# Altium schematic symbol library jlcpcb_2025_04_capacitors_extended_1210.schlib: 709 symbols (part 2 of 4) (continued)
## CC1210JKNPO0BN222
designator C?  Capacitance: 2.2nF  (hidden comment: *)
Capacitor, Ceramic (MLCC), 2.2nF, ±5%, 100V, NP0, ±5%, SMD 1210; Manufacturer: YAGEO; Manufacturer Part Number: CC1210JKNPO0BN222; Package Size: 1210; JLCPCB Basic Part: No; JLCPCB Part Number: C577264; Supplier 1: LCSC; Category: Capacitors - MLCC; Supplier Part Number 1: C577264; Tolerance: ±5%; Voltage Rating: 100V; Temperature Coefficient: NP0; RoHS: Yes; ComponentLink1Description: Datasheet; ComponentLink1URL: https://wmsc.lcsc.com/wmsc/upload/file/pdf/v2/lcsc/2008171234_YAGEO-CC1210JKNPO0BN222_C577264.pdf; ComponentLink2Description: JLCPCB Part URL; ComponentLink2URL: https://jlcpcb.com/partdetail/C577264; ComponentLink3Description: LCSC Part URL; ComponentLink3URL: https://lcsc.com/product-detail/Multilayer-Ceramic-Capacitors-MLCC---SMD-SMT_YAGEO-YAGEO-CC1210JKNPO0BN222_C577264.html
footprint CAP-1210 (1210 (3225M) Capacitor)
pins: 1, 2

## CC1210JKNPO9BN472
designator C?  Capacitance: 4.7nF  (hidden comment: *)
Capacitor, Ceramic (MLCC), 4.7nF, ±5%, 50V, NP0, ±5%, SMD 1210; Manufacturer: YAGEO; Manufacturer Part Number: CC1210JKNPO9BN472; Package Size: 1210; JLCPCB Basic Part: No; JLCPCB Part Number: C577266; Supplier 1: LCSC; Category: Capacitors - MLCC; Supplier Part Number 1: C577266; Tolerance: ±5%; Voltage Rating: 50V; Temperature Coefficient: NP0; RoHS: Yes; ComponentLink1Description: Datasheet; ComponentLink1URL: https://wmsc.lcsc.com/wmsc/upload/file/pdf/v2/lcsc/2008201234_YAGEO-CC1210JKNPO9BN472_C577266.pdf; ComponentLink2Description: JLCPCB Part URL; ComponentLink2URL: https://jlcpcb.com/partdetail/C577266; ComponentLink3Description: LCSC Part URL; ComponentLink3URL: https://lcsc.com/product-detail/Multilayer-Ceramic-Capacitors-MLCC---SMD-SMT_YAGEO-YAGEO-CC1210JKNPO9BN472_C577266.html
footprint CAP-1210 (1210 (3225M) Capacitor)
pins: 1, 2

## CC1210JKNPOCBN471
designator C?  Capacitance: 470pF  (hidden comment: *)
Capacitor, Ceramic (MLCC), 470pF, ±5%, 1kV, NP0, ±5%, SMD 1210; Manufacturer: YAGEO; Manufacturer Part Number: CC1210JKNPOCBN471; Package Size: 1210; JLCPCB Basic Part: No; JLCPCB Part Number: C577269; Supplier 1: LCSC; Category: Capacitors - MLCC; Supplier Part Number 1: C577269; Tolerance: ±5%; Voltage Rating: 1kV; Temperature Coefficient: NP0; RoHS: Yes; ComponentLink1Description: Datasheet; ComponentLink1URL: https://wmsc.lcsc.com/wmsc/upload/file/pdf/v2/lcsc/2204121100_YAGEO-CC1210JKNPOCBN471_C577269.pdf; ComponentLink2Description: JLCPCB Part URL; ComponentLink2URL: https://jlcpcb.com/partdetail/C577269; ComponentLink3Description: LCSC Part URL; ComponentLink3URL: https://lcsc.com/product-detail/Multilayer-Ceramic-Capacitors-MLCC---SMD-SMT_YAGEO-YAGEO-CC1210JKNPOCBN471_C577269.html
footprint CAP-1210 (1210 (3225M) Capacitor)
pins: 1, 2

## CC1210JKNPODBN221
designator C?  Capacitance: 220pF  (hidden comment: *)
Capacitor, Ceramic (MLCC), 220pF, ±5%, 2kV, NP0, ±5%, SMD 1210; Manufacturer: YAGEO; Manufacturer Part Number: CC1210JKNPODBN221; Package Size: 1210; JLCPCB Basic Part: No; JLCPCB Part Number: C2175583; Supplier 1: LCSC; Category: Capacitors - MLCC; Supplier Part Number 1: C2175583; Tolerance: ±5%; Voltage Rating: 2kV; Temperature Coefficient: NP0; RoHS: Yes; ComponentLink1Description: Datasheet; ComponentLink1URL: https://wmsc.lcsc.com/wmsc/upload/file/pdf/v2/lcsc/2108051830_YAGEO-CC1210JKNPODBN221_C2175583.pdf; ComponentLink2Description: JLCPCB Part URL; ComponentLink2URL: https://jlcpcb.com/partdetail/C2175583; ComponentLink3Description: LCSC Part URL; ComponentLink3URL: https://lcsc.com/product-detail/Multilayer-Ceramic-Capacitors-MLCC---SMD-SMT_YAGEO-YAGEO-CC1210JKNPODBN221_C2175583.html
footprint CAP-1210 (1210 (3225M) Capacitor)
pins: 1, 2

## CC1210KKX5R6BB226
designator C?  Capacitance: 22uF  (hidden comment: *)
Capacitor, Ceramic (MLCC), 22uF, ±10%, 10V, X5R, ±10%, SMD 1210; Manufacturer: YAGEO; Manufacturer Part Number: CC1210KKX5R6BB226; Package Size: 1210; JLCPCB Basic Part: No; JLCPCB Part Number: C3879681; Supplier 1: LCSC; Category: Capacitors - MLCC; Supplier Part Number 1: C3879681; Tolerance: ±10%; Voltage Rating: 10V; Temperature Coefficient: X5R; RoHS: Yes; ComponentLink1Description: Datasheet; ComponentLink1URL: https://wmsc.lcsc.com/wmsc/upload/file/pdf/v2/lcsc/2407081117_YAGEO-CC1210KKX5R6BB226_C3879681.pdf; ComponentLink2Description: JLCPCB Part URL; ComponentLink2URL: https://jlcpcb.com/partdetail/C3879681; ComponentLink3Description: LCSC Part URL; ComponentLink3URL: https://lcsc.com/product-detail/Multilayer-Ceramic-Capacitors-MLCC---SMD-SMT_YAGEO-YAGEO-CC1210KKX5R6BB226_C3879681.html
footprint CAP-1210 (1210 (3225M) Capacitor)
pins: 1, 2

## CC1210KKX5R7BB106
designator C?  Capacitance: 10uF  (hidden comment: *)
Capacitor, Ceramic (MLCC), 10uF, ±10%, 16V, X5R, ±10%, SMD 1210; Manufacturer: YAGEO; Manufacturer Part Number: CC1210KKX5R7BB106; Package Size: 1210; JLCPCB Basic Part: No; JLCPCB Part Number: C2179259; Supplier 1: LCSC; Category: Capacitors - MLCC; Supplier Part Number 1: C2179259; Tolerance: ±10%; Voltage Rating: 16V; Temperature Coefficient: X5R; RoHS: Yes; ComponentLink1Description: Datasheet; ComponentLink1URL: https://wmsc.lcsc.com/wmsc/upload/file/pdf/v2/lcsc/2407081117_YAGEO-CC1210KKX5R7BB106_C2179259.pdf; ComponentLink2Description: JLCPCB Part URL; ComponentLink2URL: https://jlcpcb.com/partdetail/C2179259; ComponentLink3Description: LCSC Part URL; ComponentLink3URL: https://lcsc.com/product-detail/Multilayer-Ceramic-Capacitors-MLCC---SMD-SMT_YAGEO-YAGEO-CC1210KKX5R7BB106_C2179259.html
footprint CAP-1210 (1210 (3225M) Capacitor)
pins: 1, 2

## CC1210KKX5R7BB226
designator C?  Capacitance: 22uF  (hidden comment: *)
Capacitor, Ceramic (MLCC), 22uF, ±10%, 16V, X5R, ±10%, SMD 1210; Manufacturer: YAGEO; Manufacturer Part Number: CC1210KKX5R7BB226; Package Size: 1210; JLCPCB Basic Part: No; JLCPCB Part Number: C596321; Supplier 1: LCSC; Category: Capacitors - MLCC; Supplier Part Number 1: C596321; Tolerance: ±10%; Voltage Rating: 16V; Temperature Coefficient: X5R; RoHS: Yes; ComponentLink1Description: Datasheet; ComponentLink1URL: https://wmsc.lcsc.com/wmsc/upload/file/pdf/v2/lcsc/2407081117_YAGEO-CC1210KKX5R7BB226_C596321.pdf; ComponentLink2Description: JLCPCB Part URL; ComponentLink2URL: https://jlcpcb.com/partdetail/C596321; ComponentLink3Description: LCSC Part URL; ComponentLink3URL: https://lcsc.com/product-detail/Multilayer-Ceramic-Capacitors-MLCC---SMD-SMT_YAGEO-YAGEO-CC1210KKX5R7BB226_C596321.html
footprint CAP-1210 (1210 (3225M) Capacitor)
pins: 1, 2

## CC1210KKX5R7BB475
designator C?  Capacitance: 4.7uF  (hidden comment: *)
Capacitor, Ceramic (MLCC), 4.7uF, ±10%, 16V, X5R, ±10%, SMD 1210; Manufacturer: YAGEO; Manufacturer Part Number: CC1210KKX5R7BB475; Package Size: 1210; JLCPCB Basic Part: No; JLCPCB Part Number: C2177070; Supplier 1: LCSC; Category: Capacitors - MLCC; Supplier Part Number 1: C2177070; Tolerance: ±10%; Voltage Rating: 16V; Temperature Coefficient: X5R; RoHS: Yes; ComponentLink1Description: Datasheet; ComponentLink1URL: https://wmsc.lcsc.com/wmsc/upload/file/pdf/v2/lcsc/2407081117_YAGEO-CC1210KKX5R7BB475_C2177070.pdf; ComponentLink2Description: JLCPCB Part URL; ComponentLink2URL: https://jlcpcb.com/partdetail/C2177070; ComponentLink3Description: LCSC Part URL; ComponentLink3URL: https://lcsc.com/product-detail/Multilayer-Ceramic-Capacitors-MLCC---SMD-SMT_YAGEO-YAGEO-CC1210KKX5R7BB475_C2177070.html
footprint CAP-1210 (1210 (3225M) Capacitor)
pins: 1, 2

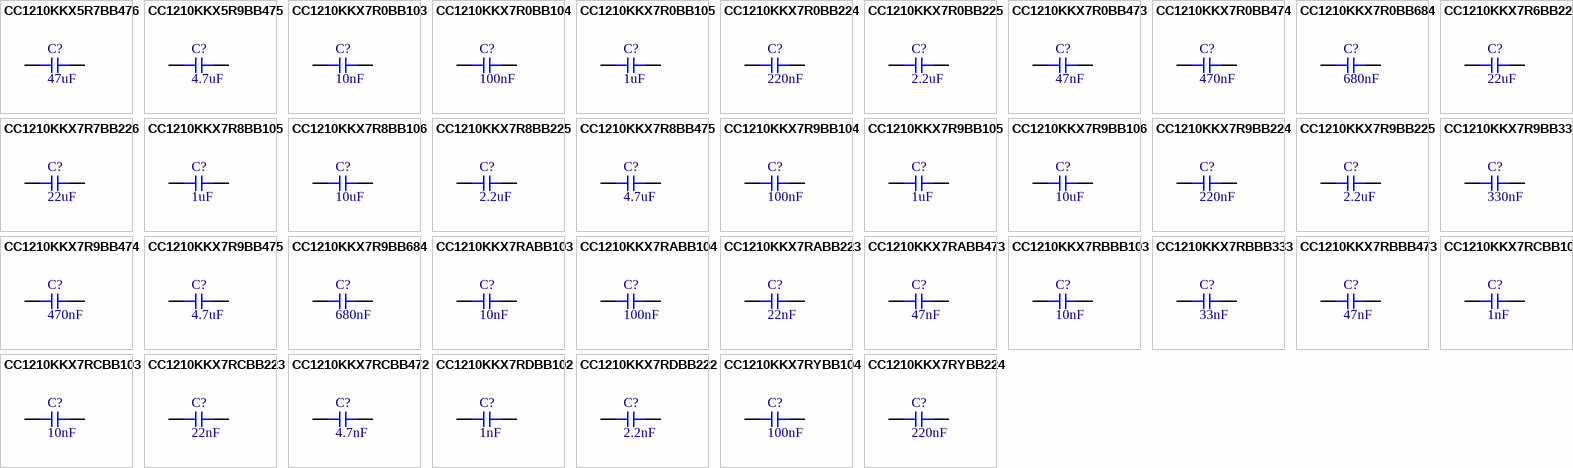
[diagram p7: symbols CC1210KKX5R7BB476 to CC1210KKX7RYBB224]

## CC1210KKX5R7BB476
designator C?  Capacitance: 47uF  (hidden comment: *)
Capacitor, Ceramic (MLCC), 47uF, ±10%, 16V, X5R, ±10%, SMD 1210; Manufacturer: YAGEO; Manufacturer Part Number: CC1210KKX5R7BB476; Package Size: 1210; JLCPCB Basic Part: No; JLCPCB Part Number: C596320; Supplier 1: LCSC; Category: Capacitors - MLCC; Supplier Part Number 1: C596320; Tolerance: ±10%; Voltage Rating: 16V; Temperature Coefficient: X5R; RoHS: Yes; ComponentLink1Description: Datasheet; ComponentLink1URL: https://wmsc.lcsc.com/wmsc/upload/file/pdf/v2/lcsc/2407081117_YAGEO-CC1210KKX5R7BB476_C596320.pdf; ComponentLink2Description: JLCPCB Part URL; ComponentLink2URL: https://jlcpcb.com/partdetail/C596320; ComponentLink3Description: LCSC Part URL; ComponentLink3URL: https://lcsc.com/product-detail/Multilayer-Ceramic-Capacitors-MLCC---SMD-SMT_YAGEO-YAGEO-CC1210KKX5R7BB476_C596320.html
footprint CAP-1210 (1210 (3225M) Capacitor)
pins: 1, 2

## CC1210KKX5R9BB475
designator C?  Capacitance: 4.7uF  (hidden comment: *)
Capacitor, Ceramic (MLCC), 4.7uF, ±10%, 50V, X5R, ±10%, SMD 1210; Manufacturer: YAGEO; Manufacturer Part Number: CC1210KKX5R9BB475; Package Size: 1210; JLCPCB Basic Part: No; JLCPCB Part Number: C1952590; Supplier 1: LCSC; Category: Capacitors - MLCC; Supplier Part Number 1: C1952590; Tolerance: ±10%; Voltage Rating: 50V; Temperature Coefficient: X5R; RoHS: Yes; ComponentLink1Description: Datasheet; ComponentLink1URL: https://wmsc.lcsc.com/wmsc/upload/file/pdf/v2/lcsc/2407081117_YAGEO-CC1210KKX5R9BB475_C1952590.pdf; ComponentLink2Description: JLCPCB Part URL; ComponentLink2URL: https://jlcpcb.com/partdetail/C1952590; ComponentLink3Description: LCSC Part URL; ComponentLink3URL: https://lcsc.com/product-detail/Multilayer-Ceramic-Capacitors-MLCC---SMD-SMT_YAGEO-YAGEO-CC1210KKX5R9BB475_C1952590.html
footprint CAP-1210 (1210 (3225M) Capacitor)
pins: 1, 2

## CC1210KKX7R0BB103
designator C?  Capacitance: 10nF  (hidden comment: *)
Capacitor, Ceramic (MLCC), 10nF, ±10%, 100V, X7R, ±10%, SMD 1210; Manufacturer: YAGEO; Manufacturer Part Number: CC1210KKX7R0BB103; Package Size: 1210; JLCPCB Basic Part: No; JLCPCB Part Number: C527374; Supplier 1: LCSC; Category: Capacitors - MLCC; Supplier Part Number 1: C527374; Tolerance: ±10%; Voltage Rating: 100V; Temperature Coefficient: X7R; RoHS: Yes; ComponentLink1Description: Datasheet; ComponentLink1URL: https://wmsc.lcsc.com/wmsc/upload/file/pdf/v2/lcsc/2007091835_YAGEO-CC1210KKX7R0BB103_C527374.pdf; ComponentLink2Description: JLCPCB Part URL; ComponentLink2URL: https://jlcpcb.com/partdetail/C527374; ComponentLink3Description: LCSC Part URL; ComponentLink3URL: https://lcsc.com/product-detail/Multilayer-Ceramic-Capacitors-MLCC---SMD-SMT_YAGEO-YAGEO-CC1210KKX7R0BB103_C527374.html
footprint CAP-1210 (1210 (3225M) Capacitor)
pins: 1, 2

## CC1210KKX7R0BB104
designator C?  Capacitance: 100nF  (hidden comment: *)
Capacitor, Ceramic (MLCC), 100nF, ±10%, 100V, X7R, ±10%, SMD 1210; Manufacturer: YAGEO; Manufacturer Part Number: CC1210KKX7R0BB104; Package Size: 1210; JLCPCB Basic Part: No; JLCPCB Part Number: C527375; Supplier 1: LCSC; Category: Capacitors - MLCC; Supplier Part Number 1: C527375; Tolerance: ±10%; Voltage Rating: 100V; Temperature Coefficient: X7R; RoHS: Yes; ComponentLink1Description: Datasheet; ComponentLink1URL: https://wmsc.lcsc.com/wmsc/upload/file/pdf/v2/lcsc/2005261833_YAGEO-CC1210KKX7R0BB104_C527375.pdf; ComponentLink2Description: JLCPCB Part URL; ComponentLink2URL: https://jlcpcb.com/partdetail/C527375; ComponentLink3Description: LCSC Part URL; ComponentLink3URL: https://lcsc.com/product-detail/Multilayer-Ceramic-Capacitors-MLCC---SMD-SMT_YAGEO-YAGEO-CC1210KKX7R0BB104_C527375.html
footprint CAP-1210 (1210 (3225M) Capacitor)
pins: 1, 2

## CC1210KKX7R0BB105
designator C?  Capacitance: 1uF  (hidden comment: *)
Capacitor, Ceramic (MLCC), 1uF, ±10%, 100V, X7R, ±10%, SMD 1210; Manufacturer: YAGEO; Manufacturer Part Number: CC1210KKX7R0BB105; Package Size: 1210; JLCPCB Basic Part: No; JLCPCB Part Number: C577270; Supplier 1: LCSC; Category: Capacitors - MLCC; Supplier Part Number 1: C577270; Tolerance: ±10%; Voltage Rating: 100V; Temperature Coefficient: X7R; RoHS: Yes; ComponentLink1Description: Datasheet; ComponentLink1URL: https://wmsc.lcsc.com/wmsc/upload/file/pdf/v2/lcsc/2009261809_YAGEO-CC1210KKX7R0BB105_C577270.pdf; ComponentLink2Description: JLCPCB Part URL; ComponentLink2URL: https://jlcpcb.com/partdetail/C577270; ComponentLink3Description: LCSC Part URL; ComponentLink3URL: https://lcsc.com/product-detail/Multilayer-Ceramic-Capacitors-MLCC---SMD-SMT_YAGEO-YAGEO-CC1210KKX7R0BB105_C577270.html
footprint CAP-1210 (1210 (3225M) Capacitor)
pins: 1, 2

## CC1210KKX7R0BB224
designator C?  Capacitance: 220nF  (hidden comment: *)
Capacitor, Ceramic (MLCC), 220nF, ±10%, 100V, X7R, ±10%, SMD 1210; Manufacturer: YAGEO; Manufacturer Part Number: CC1210KKX7R0BB224; Package Size: 1210; JLCPCB Basic Part: No; JLCPCB Part Number: C326640; Supplier 1: LCSC; Category: Capacitors - MLCC; Supplier Part Number 1: C326640; Tolerance: ±10%; Voltage Rating: 100V; Temperature Coefficient: X7R; RoHS: Yes; ComponentLink1Description: Datasheet; ComponentLink1URL: https://wmsc.lcsc.com/wmsc/upload/file/pdf/v2/lcsc/1811141242_YAGEO-CC1210KKX7R0BB224_C326640.pdf; ComponentLink2Description: JLCPCB Part URL; ComponentLink2URL: https://jlcpcb.com/partdetail/C326640; ComponentLink3Description: LCSC Part URL; ComponentLink3URL: https://lcsc.com/product-detail/Multilayer-Ceramic-Capacitors-MLCC---SMD-SMT_YAGEO-YAGEO-CC1210KKX7R0BB224_C326640.html
footprint CAP-1210 (1210 (3225M) Capacitor)
pins: 1, 2

## CC1210KKX7R0BB225
designator C?  Capacitance: 2.2uF  (hidden comment: *)
Capacitor, Ceramic (MLCC), 2.2uF, ±10%, 100V, X7R, ±10%, SMD 1210; Manufacturer: YAGEO; Manufacturer Part Number: CC1210KKX7R0BB225; Package Size: 1210; JLCPCB Basic Part: No; JLCPCB Part Number: C577271; Supplier 1: LCSC; Category: Capacitors - MLCC; Supplier Part Number 1: C577271; Tolerance: ±10%; Voltage Rating: 100V; Temperature Coefficient: X7R; RoHS: Yes; ComponentLink1Description: Datasheet; ComponentLink1URL: https://wmsc.lcsc.com/wmsc/upload/file/pdf/v2/lcsc/2012141237_YAGEO-CC1210KKX7R0BB225_C577271.pdf; ComponentLink2Description: JLCPCB Part URL; ComponentLink2URL: https://jlcpcb.com/partdetail/C577271; ComponentLink3Description: LCSC Part URL; ComponentLink3URL: https://lcsc.com/product-detail/Multilayer-Ceramic-Capacitors-MLCC---SMD-SMT_YAGEO-YAGEO-CC1210KKX7R0BB225_C577271.html
footprint CAP-1210 (1210 (3225M) Capacitor)
pins: 1, 2

## CC1210KKX7R0BB473
designator C?  Capacitance: 47nF  (hidden comment: *)
Capacitor, Ceramic (MLCC), 47nF, ±10%, 100V, X7R, ±10%, SMD 1210; Manufacturer: YAGEO; Manufacturer Part Number: CC1210KKX7R0BB473; Package Size: 1210; JLCPCB Basic Part: No; JLCPCB Part Number: C2897342; Supplier 1: LCSC; Category: Capacitors - MLCC; Supplier Part Number 1: C2897342; Tolerance: ±10%; Voltage Rating: 100V; Temperature Coefficient: X7R; RoHS: Yes; ComponentLink1Description: Datasheet; ComponentLink1URL: https://wmsc.lcsc.com/wmsc/upload/file/pdf/v2/lcsc/2211211800_YAGEO-CC1210KKX7R0BB473_C2897342.pdf; ComponentLink2Description: JLCPCB Part URL; ComponentLink2URL: https://jlcpcb.com/partdetail/C2897342; ComponentLink3Description: LCSC Part URL; ComponentLink3URL: https://lcsc.com/product-detail/Multilayer-Ceramic-Capacitors-MLCC---SMD-SMT_YAGEO-YAGEO-CC1210KKX7R0BB473_C2897342.html
footprint CAP-1210 (1210 (3225M) Capacitor)
pins: 1, 2

## CC1210KKX7R0BB474
designator C?  Capacitance: 470nF  (hidden comment: *)
Capacitor, Ceramic (MLCC), 470nF, ±10%, 100V, X7R, ±10%, SMD 1210; Manufacturer: YAGEO; Manufacturer Part Number: CC1210KKX7R0BB474; Package Size: 1210; JLCPCB Basic Part: No; JLCPCB Part Number: C577272; Supplier 1: LCSC; Category: Capacitors - MLCC; Supplier Part Number 1: C577272; Tolerance: ±10%; Voltage Rating: 100V; Temperature Coefficient: X7R; RoHS: Yes; ComponentLink1Description: Datasheet; ComponentLink1URL: https://wmsc.lcsc.com/wmsc/upload/file/pdf/v2/lcsc/2112291830_YAGEO-CC1210KKX7R0BB474_C577272.pdf; ComponentLink2Description: JLCPCB Part URL; ComponentLink2URL: https://jlcpcb.com/partdetail/C577272; ComponentLink3Description: LCSC Part URL; ComponentLink3URL: https://lcsc.com/product-detail/Multilayer-Ceramic-Capacitors-MLCC---SMD-SMT_YAGEO-YAGEO-CC1210KKX7R0BB474_C577272.html
footprint CAP-1210 (1210 (3225M) Capacitor)
pins: 1, 2

## CC1210KKX7R0BB684
designator C?  Capacitance: 680nF  (hidden comment: *)
Capacitor, Ceramic (MLCC), 680nF, ±10%, 100V, X7R, ±10%, SMD 1210; Manufacturer: YAGEO; Manufacturer Part Number: CC1210KKX7R0BB684; Package Size: 1210; JLCPCB Basic Part: No; JLCPCB Part Number: C1855513; Supplier 1: LCSC; Category: Capacitors - MLCC; Supplier Part Number 1: C1855513; Tolerance: ±10%; Voltage Rating: 100V; Temperature Coefficient: X7R; RoHS: Yes; ComponentLink1Description: Datasheet; ComponentLink1URL: https://wmsc.lcsc.com/wmsc/upload/file/pdf/v2/lcsc/2201271230_YAGEO-CC1210KKX7R0BB684_C1855513.pdf; ComponentLink2Description: JLCPCB Part URL; ComponentLink2URL: https://jlcpcb.com/partdetail/C1855513; ComponentLink3Description: LCSC Part URL; ComponentLink3URL: https://lcsc.com/product-detail/Multilayer-Ceramic-Capacitors-MLCC---SMD-SMT_YAGEO-YAGEO-CC1210KKX7R0BB684_C1855513.html
footprint CAP-1210 (1210 (3225M) Capacitor)
pins: 1, 2

## CC1210KKX7R6BB226
designator C?  Capacitance: 22uF  (hidden comment: *)
Capacitor, Ceramic (MLCC), 22uF, ±10%, 10V, X7R, ±10%, SMD 1210; Manufacturer: YAGEO; Manufacturer Part Number: CC1210KKX7R6BB226; Package Size: 1210; JLCPCB Basic Part: No; JLCPCB Part Number: C1952581; Supplier 1: LCSC; Category: Capacitors - MLCC; Supplier Part Number 1: C1952581; Tolerance: ±10%; Voltage Rating: 10V; Temperature Coefficient: X7R; RoHS: Yes; ComponentLink1Description: Datasheet; ComponentLink1URL: https://wmsc.lcsc.com/wmsc/upload/file/pdf/v2/lcsc/2201291000_YAGEO-CC1210KKX7R6BB226_C1952581.pdf; ComponentLink2Description: JLCPCB Part URL; ComponentLink2URL: https://jlcpcb.com/partdetail/C1952581; ComponentLink3Description: LCSC Part URL; ComponentLink3URL: https://lcsc.com/product-detail/Multilayer-Ceramic-Capacitors-MLCC---SMD-SMT_YAGEO-YAGEO-CC1210KKX7R6BB226_C1952581.html
footprint CAP-1210 (1210 (3225M) Capacitor)
pins: 1, 2

## CC1210KKX7R7BB226
designator C?  Capacitance: 22uF  (hidden comment: *)
Capacitor, Ceramic (MLCC), 22uF, ±10%, 16V, X7R, ±10%, SMD 1210; Manufacturer: YAGEO; Manufacturer Part Number: CC1210KKX7R7BB226; Package Size: 1210; JLCPCB Basic Part: No; JLCPCB Part Number: C723751; Supplier 1: LCSC; Category: Capacitors - MLCC; Supplier Part Number 1: C723751; Tolerance: ±10%; Voltage Rating: 16V; Temperature Coefficient: X7R; RoHS: Yes; ComponentLink1Description: Datasheet; ComponentLink1URL: https://wmsc.lcsc.com/wmsc/upload/file/pdf/v2/lcsc/2206172015_YAGEO-CC1210KKX7R7BB226_C723751.pdf; ComponentLink2Description: JLCPCB Part URL; ComponentLink2URL: https://jlcpcb.com/partdetail/C723751; ComponentLink3Description: LCSC Part URL; ComponentLink3URL: https://lcsc.com/product-detail/Multilayer-Ceramic-Capacitors-MLCC---SMD-SMT_YAGEO-YAGEO-CC1210KKX7R7BB226_C723751.html
footprint CAP-1210 (1210 (3225M) Capacitor)
pins: 1, 2

## CC1210KKX7R8BB105
designator C?  Capacitance: 1uF  (hidden comment: *)
Capacitor, Ceramic (MLCC), 1uF, ±10%, 25V, X7R, ±10%, SMD 1210; Manufacturer: YAGEO; Manufacturer Part Number: CC1210KKX7R8BB105; Package Size: 1210; JLCPCB Basic Part: No; JLCPCB Part Number: C326638; Supplier 1: LCSC; Category: Capacitors - MLCC; Supplier Part Number 1: C326638; Tolerance: ±10%; Voltage Rating: 25V; Temperature Coefficient: X7R; RoHS: Yes; ComponentLink1Description: Datasheet; ComponentLink1URL: https://wmsc.lcsc.com/wmsc/upload/file/pdf/v2/lcsc/1811141232_YAGEO-CC1210KKX7R8BB105_C326638.pdf; ComponentLink2Description: JLCPCB Part URL; ComponentLink2URL: https://jlcpcb.com/partdetail/C326638; ComponentLink3Description: LCSC Part URL; ComponentLink3URL: https://lcsc.com/product-detail/Multilayer-Ceramic-Capacitors-MLCC---SMD-SMT_YAGEO-YAGEO-CC1210KKX7R8BB105_C326638.html
footprint CAP-1210 (1210 (3225M) Capacitor)
pins: 1, 2

## CC1210KKX7R8BB106
designator C?  Capacitance: 10uF  (hidden comment: *)
Capacitor, Ceramic (MLCC), 10uF, ±10%, 25V, X7R, ±10%, SMD 1210; Manufacturer: YAGEO; Manufacturer Part Number: CC1210KKX7R8BB106; Package Size: 1210; JLCPCB Basic Part: No; JLCPCB Part Number: C700527; Supplier 1: LCSC; Category: Capacitors - MLCC; Supplier Part Number 1: C700527; Tolerance: ±10%; Voltage Rating: 25V; Temperature Coefficient: X7R; RoHS: Yes; ComponentLink1Description: Datasheet; ComponentLink1URL: https://wmsc.lcsc.com/wmsc/upload/file/pdf/v2/lcsc/2008171235_YAGEO-CC1210KKX7R8BB106_C700527.pdf; ComponentLink2Description: JLCPCB Part URL; ComponentLink2URL: https://jlcpcb.com/partdetail/C700527; ComponentLink3Description: LCSC Part URL; ComponentLink3URL: https://lcsc.com/product-detail/Multilayer-Ceramic-Capacitors-MLCC---SMD-SMT_YAGEO-YAGEO-CC1210KKX7R8BB106_C700527.html
footprint CAP-1210 (1210 (3225M) Capacitor)
pins: 1, 2

## CC1210KKX7R8BB225
designator C?  Capacitance: 2.2uF  (hidden comment: *)
Capacitor, Ceramic (MLCC), 2.2uF, ±10%, 25V, X7R, ±10%, SMD 1210; Manufacturer: YAGEO; Manufacturer Part Number: CC1210KKX7R8BB225; Package Size: 1210; JLCPCB Basic Part: No; JLCPCB Part Number: C326565; Supplier 1: LCSC; Category: Capacitors - MLCC; Supplier Part Number 1: C326565; Tolerance: ±10%; Voltage Rating: 25V; Temperature Coefficient: X7R; RoHS: Yes; ComponentLink1Description: Datasheet; ComponentLink1URL: https://wmsc.lcsc.com/wmsc/upload/file/pdf/v2/lcsc/2304140030_YAGEO-CC1210KKX7R8BB225_C326565.pdf; ComponentLink2Description: JLCPCB Part URL; ComponentLink2URL: https://jlcpcb.com/partdetail/C326565; ComponentLink3Description: LCSC Part URL; ComponentLink3URL: https://lcsc.com/product-detail/Multilayer-Ceramic-Capacitors-MLCC---SMD-SMT_YAGEO-YAGEO-CC1210KKX7R8BB225_C326565.html
footprint CAP-1210 (1210 (3225M) Capacitor)
pins: 1, 2

## CC1210KKX7R8BB475
designator C?  Capacitance: 4.7uF  (hidden comment: *)
Capacitor, Ceramic (MLCC), 4.7uF, ±10%, 25V, X7R, ±10%, SMD 1210; Manufacturer: YAGEO; Manufacturer Part Number: CC1210KKX7R8BB475; Package Size: 1210; JLCPCB Basic Part: No; JLCPCB Part Number: C2980104; Supplier 1: LCSC; Category: Capacitors - MLCC; Supplier Part Number 1: C2980104; Tolerance: ±10%; Voltage Rating: 25V; Temperature Coefficient: X7R; RoHS: Yes; ComponentLink1Description: Datasheet; ComponentLink1URL: https://wmsc.lcsc.com/wmsc/upload/file/pdf/v2/lcsc/2203071730_YAGEO-CC1210KKX7R8BB475_C2980104.pdf; ComponentLink2Description: JLCPCB Part URL; ComponentLink2URL: https://jlcpcb.com/partdetail/C2980104; ComponentLink3Description: LCSC Part URL; ComponentLink3URL: https://lcsc.com/product-detail/Multilayer-Ceramic-Capacitors-MLCC---SMD-SMT_YAGEO-YAGEO-CC1210KKX7R8BB475_C2980104.html
footprint CAP-1210 (1210 (3225M) Capacitor)
pins: 1, 2

## CC1210KKX7R9BB104
designator C?  Capacitance: 100nF  (hidden comment: *)
Capacitor, Ceramic (MLCC), 100nF, ±10%, 50V, X7R, ±10%, SMD 1210; Manufacturer: YAGEO; Manufacturer Part Number: CC1210KKX7R9BB104; Package Size: 1210; JLCPCB Basic Part: No; JLCPCB Part Number: C412504; Supplier 1: LCSC; Category: Capacitors - MLCC; Supplier Part Number 1: C412504; Tolerance: ±10%; Voltage Rating: 50V; Temperature Coefficient: X7R; RoHS: Yes; ComponentLink1Description: Datasheet; ComponentLink1URL: https://wmsc.lcsc.com/wmsc/upload/file/pdf/v2/lcsc/1912111437_YAGEO-CC1210KKX7R9BB104_C412504.pdf; ComponentLink2Description: JLCPCB Part URL; ComponentLink2URL: https://jlcpcb.com/partdetail/C412504; ComponentLink3Description: LCSC Part URL; ComponentLink3URL: https://lcsc.com/product-detail/Multilayer-Ceramic-Capacitors-MLCC---SMD-SMT_YAGEO-YAGEO-CC1210KKX7R9BB104_C412504.html
footprint CAP-1210 (1210 (3225M) Capacitor)
pins: 1, 2

## CC1210KKX7R9BB105
designator C?  Capacitance: 1uF  (hidden comment: *)
Capacitor, Ceramic (MLCC), 1uF, ±10%, 50V, X7R, ±10%, SMD 1210; Manufacturer: YAGEO; Manufacturer Part Number: CC1210KKX7R9BB105; Package Size: 1210; JLCPCB Basic Part: No; JLCPCB Part Number: C393665; Supplier 1: LCSC; Category: Capacitors - MLCC; Supplier Part Number 1: C393665; Tolerance: ±10%; Voltage Rating: 50V; Temperature Coefficient: X7R; RoHS: Yes; ComponentLink1Description: Datasheet; ComponentLink1URL: https://wmsc.lcsc.com/wmsc/upload/file/pdf/v2/lcsc/1912111437_YAGEO-CC1210KKX7R9BB105_C393665.pdf; ComponentLink2Description: JLCPCB Part URL; ComponentLink2URL: https://jlcpcb.com/partdetail/C393665; ComponentLink3Description: LCSC Part URL; ComponentLink3URL: https://lcsc.com/product-detail/Multilayer-Ceramic-Capacitors-MLCC---SMD-SMT_YAGEO-YAGEO-CC1210KKX7R9BB105_C393665.html
footprint CAP-1210 (1210 (3225M) Capacitor)
pins: 1, 2

## CC1210KKX7R9BB106
designator C?  Capacitance: 10uF  (hidden comment: *)
Capacitor, Ceramic (MLCC), 10uF, ±10%, 50V, X7R, ±10%, SMD 1210; Manufacturer: YAGEO; Manufacturer Part Number: CC1210KKX7R9BB106; Package Size: 1210; JLCPCB Basic Part: No; JLCPCB Part Number: C596319; Supplier 1: LCSC; Category: Capacitors - MLCC; Supplier Part Number 1: C596319; Tolerance: ±10%; Voltage Rating: 50V; Temperature Coefficient: X7R; RoHS: Yes; ComponentLink1Description: Datasheet; ComponentLink1URL: https://wmsc.lcsc.com/wmsc/upload/file/pdf/v2/lcsc/2006091815_YAGEO-CC1210KKX7R9BB106_C596319.pdf; ComponentLink2Description: JLCPCB Part URL; ComponentLink2URL: https://jlcpcb.com/partdetail/C596319; ComponentLink3Description: LCSC Part URL; ComponentLink3URL: https://lcsc.com/product-detail/Multilayer-Ceramic-Capacitors-MLCC---SMD-SMT_YAGEO-YAGEO-CC1210KKX7R9BB106_C596319.html
footprint CAP-1210 (1210 (3225M) Capacitor)
pins: 1, 2

## CC1210KKX7R9BB224
designator C?  Capacitance: 220nF  (hidden comment: *)
Capacitor, Ceramic (MLCC), 220nF, ±10%, 50V, X7R, ±10%, SMD 1210; Manufacturer: YAGEO; Manufacturer Part Number: CC1210KKX7R9BB224; Package Size: 1210; JLCPCB Basic Part: No; JLCPCB Part Number: C577275; Supplier 1: LCSC; Category: Capacitors - MLCC; Supplier Part Number 1: C577275; Tolerance: ±10%; Voltage Rating: 50V; Temperature Coefficient: X7R; RoHS: Yes; ComponentLink1Description: Datasheet; ComponentLink1URL: https://wmsc.lcsc.com/wmsc/upload/file/pdf/v2/lcsc/2011301940_YAGEO-CC1210KKX7R9BB224_C577275.pdf; ComponentLink2Description: JLCPCB Part URL; ComponentLink2URL: https://jlcpcb.com/partdetail/C577275; ComponentLink3Description: LCSC Part URL; ComponentLink3URL: https://lcsc.com/product-detail/Multilayer-Ceramic-Capacitors-MLCC---SMD-SMT_YAGEO-YAGEO-CC1210KKX7R9BB224_C577275.html
footprint CAP-1210 (1210 (3225M) Capacitor)
pins: 1, 2

## CC1210KKX7R9BB225
designator C?  Capacitance: 2.2uF  (hidden comment: *)
Capacitor, Ceramic (MLCC), 2.2uF, ±10%, 50V, X7R, ±10%, SMD 1210; Manufacturer: YAGEO; Manufacturer Part Number: CC1210KKX7R9BB225; Package Size: 1210; JLCPCB Basic Part: No; JLCPCB Part Number: C577276; Supplier 1: LCSC; Category: Capacitors - MLCC; Supplier Part Number 1: C577276; Tolerance: ±10%; Voltage Rating: 50V; Temperature Coefficient: X7R; RoHS: Yes; ComponentLink1Description: Datasheet; ComponentLink1URL: https://wmsc.lcsc.com/wmsc/upload/file/pdf/v2/lcsc/2204271615_YAGEO-CC1210KKX7R9BB225_C577276.pdf; ComponentLink2Description: JLCPCB Part URL; ComponentLink2URL: https://jlcpcb.com/partdetail/C577276; ComponentLink3Description: LCSC Part URL; ComponentLink3URL: https://lcsc.com/product-detail/Multilayer-Ceramic-Capacitors-MLCC---SMD-SMT_YAGEO-YAGEO-CC1210KKX7R9BB225_C577276.html
footprint CAP-1210 (1210 (3225M) Capacitor)
pins: 1, 2

## CC1210KKX7R9BB334
designator C?  Capacitance: 330nF  (hidden comment: *)
Capacitor, Ceramic (MLCC), 330nF, ±10%, 50V, X7R, ±10%, SMD 1210; Manufacturer: YAGEO; Manufacturer Part Number: CC1210KKX7R9BB334; Package Size: 1210; JLCPCB Basic Part: No; JLCPCB Part Number: C2174959; Supplier 1: LCSC; Category: Capacitors - MLCC; Supplier Part Number 1: C2174959; Tolerance: ±10%; Voltage Rating: 50V; Temperature Coefficient: X7R; RoHS: Yes; ComponentLink1Description: Datasheet; ComponentLink1URL: https://wmsc.lcsc.com/wmsc/upload/file/pdf/v2/lcsc/2202040730_YAGEO-CC1210KKX7R9BB334_C2174959.pdf; ComponentLink2Description: JLCPCB Part URL; ComponentLink2URL: https://jlcpcb.com/partdetail/C2174959; ComponentLink3Description: LCSC Part URL; ComponentLink3URL: https://lcsc.com/product-detail/Multilayer-Ceramic-Capacitors-MLCC---SMD-SMT_YAGEO-YAGEO-CC1210KKX7R9BB334_C2174959.html
footprint CAP-1210 (1210 (3225M) Capacitor)
pins: 1, 2

## CC1210KKX7R9BB474
designator C?  Capacitance: 470nF  (hidden comment: *)
Capacitor, Ceramic (MLCC), 470nF, ±10%, 50V, X7R, ±10%, SMD 1210; Manufacturer: YAGEO; Manufacturer Part Number: CC1210KKX7R9BB474; Package Size: 1210; JLCPCB Basic Part: No; JLCPCB Part Number: C309505; Supplier 1: LCSC; Category: Capacitors - MLCC; Supplier Part Number 1: C309505; Tolerance: ±10%; Voltage Rating: 50V; Temperature Coefficient: X7R; RoHS: Yes; ComponentLink1Description: Datasheet; ComponentLink1URL: https://wmsc.lcsc.com/wmsc/upload/file/pdf/v2/lcsc/2311211121_YAGEO-CC1210KKX7R9BB474_C309505.pdf; ComponentLink2Description: JLCPCB Part URL; ComponentLink2URL: https://jlcpcb.com/partdetail/C309505; ComponentLink3Description: LCSC Part URL; ComponentLink3URL: https://lcsc.com/product-detail/Multilayer-Ceramic-Capacitors-MLCC---SMD-SMT_YAGEO-YAGEO-CC1210KKX7R9BB474_C309505.html
footprint CAP-1210 (1210 (3225M) Capacitor)
pins: 1, 2

## CC1210KKX7R9BB475
designator C?  Capacitance: 4.7uF  (hidden comment: *)
Capacitor, Ceramic (MLCC), 4.7uF, ±10%, 50V, X7R, ±10%, SMD 1210; Manufacturer: YAGEO; Manufacturer Part Number: CC1210KKX7R9BB475; Package Size: 1210; JLCPCB Basic Part: No; JLCPCB Part Number: C596318; Supplier 1: LCSC; Category: Capacitors - MLCC; Supplier Part Number 1: C596318; Tolerance: ±10%; Voltage Rating: 50V; Temperature Coefficient: X7R; RoHS: Yes; ComponentLink1Description: Datasheet; ComponentLink1URL: https://wmsc.lcsc.com/wmsc/upload/file/pdf/v2/lcsc/2006091815_YAGEO-CC1210KKX7R9BB475_C596318.pdf; ComponentLink2Description: JLCPCB Part URL; ComponentLink2URL: https://jlcpcb.com/partdetail/C596318; ComponentLink3Description: LCSC Part URL; ComponentLink3URL: https://lcsc.com/product-detail/Multilayer-Ceramic-Capacitors-MLCC---SMD-SMT_YAGEO-YAGEO-CC1210KKX7R9BB475_C596318.html
footprint CAP-1210 (1210 (3225M) Capacitor)
pins: 1, 2

## CC1210KKX7R9BB684
designator C?  Capacitance: 680nF  (hidden comment: *)
Capacitor, Ceramic (MLCC), 680nF, ±10%, 50V, X7R, ±10%, SMD 1210; Manufacturer: YAGEO; Manufacturer Part Number: CC1210KKX7R9BB684; Package Size: 1210; JLCPCB Basic Part: No; JLCPCB Part Number: C577277; Supplier 1: LCSC; Category: Capacitors - MLCC; Supplier Part Number 1: C577277; Tolerance: ±10%; Voltage Rating: 50V; Temperature Coefficient: X7R; RoHS: Yes; ComponentLink1Description: Datasheet; ComponentLink1URL: https://wmsc.lcsc.com/wmsc/upload/file/pdf/v2/lcsc/2201041830_YAGEO-CC1210KKX7R9BB684_C577277.pdf; ComponentLink2Description: JLCPCB Part URL; ComponentLink2URL: https://jlcpcb.com/partdetail/C577277; ComponentLink3Description: LCSC Part URL; ComponentLink3URL: https://lcsc.com/product-detail/Multilayer-Ceramic-Capacitors-MLCC---SMD-SMT_YAGEO-YAGEO-CC1210KKX7R9BB684_C577277.html
footprint CAP-1210 (1210 (3225M) Capacitor)
pins: 1, 2

## CC1210KKX7RABB103
designator C?  Capacitance: 10nF  (hidden comment: *)
Capacitor, Ceramic (MLCC), 10nF, ±10%, 200V, X7R, ±10%, SMD 1210; Manufacturer: YAGEO; Manufacturer Part Number: CC1210KKX7RABB103; Package Size: 1210; JLCPCB Basic Part: No; JLCPCB Part Number: C1855449; Supplier 1: LCSC; Category: Capacitors - MLCC; Supplier Part Number 1: C1855449; Tolerance: ±10%; Voltage Rating: 200V; Temperature Coefficient: X7R; RoHS: Yes; ComponentLink1Description: Datasheet; ComponentLink1URL: https://wmsc.lcsc.com/wmsc/upload/file/pdf/v2/lcsc/2201271230_YAGEO-CC1210KKX7RABB103_C1855449.pdf; ComponentLink2Description: JLCPCB Part URL; ComponentLink2URL: https://jlcpcb.com/partdetail/C1855449; ComponentLink3Description: LCSC Part URL; ComponentLink3URL: https://lcsc.com/product-detail/Multilayer-Ceramic-Capacitors-MLCC---SMD-SMT_YAGEO-YAGEO-CC1210KKX7RABB103_C1855449.html
footprint CAP-1210 (1210 (3225M) Capacitor)
pins: 1, 2

## CC1210KKX7RABB104
designator C?  Capacitance: 100nF  (hidden comment: *)
Capacitor, Ceramic (MLCC), 100nF, ±10%, 200V, X7R, ±10%, SMD 1210; Manufacturer: YAGEO; Manufacturer Part Number: CC1210KKX7RABB104; Package Size: 1210; JLCPCB Basic Part: No; JLCPCB Part Number: C527376; Supplier 1: LCSC; Category: Capacitors - MLCC; Supplier Part Number 1: C527376; Tolerance: ±10%; Voltage Rating: 200V; Temperature Coefficient: X7R; RoHS: Yes; ComponentLink1Description: Datasheet; ComponentLink1URL: https://wmsc.lcsc.com/wmsc/upload/file/pdf/v2/lcsc/2005222143_YAGEO-CC1210KKX7RABB104_C527376.pdf; ComponentLink2Description: JLCPCB Part URL; ComponentLink2URL: https://jlcpcb.com/partdetail/C527376; ComponentLink3Description: LCSC Part URL; ComponentLink3URL: https://lcsc.com/product-detail/Multilayer-Ceramic-Capacitors-MLCC---SMD-SMT_YAGEO-YAGEO-CC1210KKX7RABB104_C527376.html
footprint CAP-1210 (1210 (3225M) Capacitor)
pins: 1, 2

## CC1210KKX7RABB223
designator C?  Capacitance: 22nF  (hidden comment: *)
Capacitor, Ceramic (MLCC), 22nF, ±10%, 200V, X7R, ±10%, SMD 1210; Manufacturer: YAGEO; Manufacturer Part Number: CC1210KKX7RABB223; Package Size: 1210; JLCPCB Basic Part: No; JLCPCB Part Number: C527377; Supplier 1: LCSC; Category: Capacitors - MLCC; Supplier Part Number 1: C527377; Tolerance: ±10%; Voltage Rating: 200V; Temperature Coefficient: X7R; RoHS: Yes; ComponentLink1Description: Datasheet; ComponentLink1URL: https://wmsc.lcsc.com/wmsc/upload/file/pdf/v2/lcsc/2005261833_YAGEO-CC1210KKX7RABB223_C527377.pdf; ComponentLink2Description: JLCPCB Part URL; ComponentLink2URL: https://jlcpcb.com/partdetail/C527377; ComponentLink3Description: LCSC Part URL; ComponentLink3URL: https://lcsc.com/product-detail/Multilayer-Ceramic-Capacitors-MLCC---SMD-SMT_YAGEO-YAGEO-CC1210KKX7RABB223_C527377.html
footprint CAP-1210 (1210 (3225M) Capacitor)
pins: 1, 2

## CC1210KKX7RABB473
designator C?  Capacitance: 47nF  (hidden comment: *)
Capacitor, Ceramic (MLCC), 47nF, ±10%, 200V, X7R, ±10%, SMD 1210; Manufacturer: YAGEO; Manufacturer Part Number: CC1210KKX7RABB473; Package Size: 1210; JLCPCB Basic Part: No; JLCPCB Part Number: C527378; Supplier 1: LCSC; Category: Capacitors - MLCC; Supplier Part Number 1: C527378; Tolerance: ±10%; Voltage Rating: 200V; Temperature Coefficient: X7R; RoHS: Yes; ComponentLink1Description: Datasheet; ComponentLink1URL: https://wmsc.lcsc.com/wmsc/upload/file/pdf/v2/lcsc/2005262136_YAGEO-CC1210KKX7RABB473_C527378.pdf; ComponentLink2Description: JLCPCB Part URL; ComponentLink2URL: https://jlcpcb.com/partdetail/C527378; ComponentLink3Description: LCSC Part URL; ComponentLink3URL: https://lcsc.com/product-detail/Multilayer-Ceramic-Capacitors-MLCC---SMD-SMT_YAGEO-YAGEO-CC1210KKX7RABB473_C527378.html
footprint CAP-1210 (1210 (3225M) Capacitor)
pins: 1, 2

## CC1210KKX7RBBB103
designator C?  Capacitance: 10nF  (hidden comment: *)
Capacitor, Ceramic (MLCC), 10nF, ±10%, 500V, X7R, ±10%, SMD 1210; Manufacturer: YAGEO; Manufacturer Part Number: CC1210KKX7RBBB103; Package Size: 1210; JLCPCB Basic Part: No; JLCPCB Part Number: C527379; Supplier 1: LCSC; Category: Capacitors - MLCC; Supplier Part Number 1: C527379; Tolerance: ±10%; Voltage Rating: 500V; Temperature Coefficient: X7R; RoHS: Yes; ComponentLink1Description: Datasheet; ComponentLink1URL: https://wmsc.lcsc.com/wmsc/upload/file/pdf/v2/lcsc/2006031836_YAGEO-CC1210KKX7RBBB103_C527379.pdf; ComponentLink2Description: JLCPCB Part URL; ComponentLink2URL: https://jlcpcb.com/partdetail/C527379; ComponentLink3Description: LCSC Part URL; ComponentLink3URL: https://lcsc.com/product-detail/Multilayer-Ceramic-Capacitors-MLCC---SMD-SMT_YAGEO-YAGEO-CC1210KKX7RBBB103_C527379.html
footprint CAP-1210 (1210 (3225M) Capacitor)
pins: 1, 2

## CC1210KKX7RBBB333
designator C?  Capacitance: 33nF  (hidden comment: *)
Capacitor, Ceramic (MLCC), 33nF, ±10%, 500V, X7R, ±10%, SMD 1210; Manufacturer: YAGEO; Manufacturer Part Number: CC1210KKX7RBBB333; Package Size: 1210; JLCPCB Basic Part: No; JLCPCB Part Number: C577278; Supplier 1: LCSC; Category: Capacitors - MLCC; Supplier Part Number 1: C577278; Tolerance: ±10%; Voltage Rating: 500V; Temperature Coefficient: X7R; RoHS: Yes; ComponentLink1Description: Datasheet; ComponentLink1URL: https://wmsc.lcsc.com/wmsc/upload/file/pdf/v2/lcsc/2304140030_YAGEO-CC1210KKX7RBBB333_C577278.pdf; ComponentLink2Description: JLCPCB Part URL; ComponentLink2URL: https://jlcpcb.com/partdetail/C577278; ComponentLink3Description: LCSC Part URL; ComponentLink3URL: https://lcsc.com/product-detail/Multilayer-Ceramic-Capacitors-MLCC---SMD-SMT_YAGEO-YAGEO-CC1210KKX7RBBB333_C577278.html
footprint CAP-1210 (1210 (3225M) Capacitor)
pins: 1, 2

## CC1210KKX7RBBB473
designator C?  Capacitance: 47nF  (hidden comment: *)
Capacitor, Ceramic (MLCC), 47nF, ±10%, 500V, X7R, ±10%, SMD 1210; Manufacturer: YAGEO; Manufacturer Part Number: CC1210KKX7RBBB473; Package Size: 1210; JLCPCB Basic Part: No; JLCPCB Part Number: C577279; Supplier 1: LCSC; Category: Capacitors - MLCC; Supplier Part Number 1: C577279; Tolerance: ±10%; Voltage Rating: 500V; Temperature Coefficient: X7R; RoHS: Yes; ComponentLink1Description: Datasheet; ComponentLink1URL: https://wmsc.lcsc.com/wmsc/upload/file/pdf/v2/lcsc/2012141237_YAGEO-CC1210KKX7RBBB473_C577279.pdf; ComponentLink2Description: JLCPCB Part URL; ComponentLink2URL: https://jlcpcb.com/partdetail/C577279; ComponentLink3Description: LCSC Part URL; ComponentLink3URL: https://lcsc.com/product-detail/Multilayer-Ceramic-Capacitors-MLCC---SMD-SMT_YAGEO-YAGEO-CC1210KKX7RBBB473_C577279.html
footprint CAP-1210 (1210 (3225M) Capacitor)
pins: 1, 2

## CC1210KKX7RCBB102
designator C?  Capacitance: 1nF  (hidden comment: *)
Capacitor, Ceramic (MLCC), 1nF, ±10%, 1kV, X7R, ±10%, SMD 1210; Manufacturer: YAGEO; Manufacturer Part Number: CC1210KKX7RCBB102; Package Size: 1210; JLCPCB Basic Part: No; JLCPCB Part Number: C577280; Supplier 1: LCSC; Category: Capacitors - MLCC; Supplier Part Number 1: C577280; Tolerance: ±10%; Voltage Rating: 1kV; Temperature Coefficient: X7R; RoHS: Yes; ComponentLink1Description: Datasheet; ComponentLink1URL: https://wmsc.lcsc.com/wmsc/upload/file/pdf/v2/lcsc/2204271615_YAGEO-CC1210KKX7RCBB102_C577280.pdf; ComponentLink2Description: JLCPCB Part URL; ComponentLink2URL: https://jlcpcb.com/partdetail/C577280; ComponentLink3Description: LCSC Part URL; ComponentLink3URL: https://lcsc.com/product-detail/Multilayer-Ceramic-Capacitors-MLCC---SMD-SMT_YAGEO-YAGEO-CC1210KKX7RCBB102_C577280.html
footprint CAP-1210 (1210 (3225M) Capacitor)
pins: 1, 2

## CC1210KKX7RCBB103
designator C?  Capacitance: 10nF  (hidden comment: *)
Capacitor, Ceramic (MLCC), 10nF, ±10%, 1kV, X7R, ±10%, SMD 1210; Manufacturer: YAGEO; Manufacturer Part Number: CC1210KKX7RCBB103; Package Size: 1210; JLCPCB Basic Part: No; JLCPCB Part Number: C577281; Supplier 1: LCSC; Category: Capacitors - MLCC; Supplier Part Number 1: C577281; Tolerance: ±10%; Voltage Rating: 1kV; Temperature Coefficient: X7R; RoHS: Yes; ComponentLink1Description: Datasheet; ComponentLink1URL: https://wmsc.lcsc.com/wmsc/upload/file/pdf/v2/lcsc/2204271615_YAGEO-CC1210KKX7RCBB103_C577281.pdf; ComponentLink2Description: JLCPCB Part URL; ComponentLink2URL: https://jlcpcb.com/partdetail/C577281; ComponentLink3Description: LCSC Part URL; ComponentLink3URL: https://lcsc.com/product-detail/Multilayer-Ceramic-Capacitors-MLCC---SMD-SMT_YAGEO-YAGEO-CC1210KKX7RCBB103_C577281.html
footprint CAP-1210 (1210 (3225M) Capacitor)
pins: 1, 2

## CC1210KKX7RCBB223
designator C?  Capacitance: 22nF  (hidden comment: *)
Capacitor, Ceramic (MLCC), 22nF, ±10%, 1kV, X7R, ±10%, SMD 1210; Manufacturer: YAGEO; Manufacturer Part Number: CC1210KKX7RCBB223; Package Size: 1210; JLCPCB Basic Part: No; JLCPCB Part Number: C389110; Supplier 1: LCSC; Category: Capacitors - MLCC; Supplier Part Number 1: C389110; Tolerance: ±10%; Voltage Rating: 1kV; Temperature Coefficient: X7R; RoHS: Yes; ComponentLink1Description: Datasheet; ComponentLink1URL: https://wmsc.lcsc.com/wmsc/upload/file/pdf/v2/lcsc/1912111437_YAGEO-CC1210KKX7RCBB223_C389110.pdf; ComponentLink2Description: JLCPCB Part URL; ComponentLink2URL: https://jlcpcb.com/partdetail/C389110; ComponentLink3Description: LCSC Part URL; ComponentLink3URL: https://lcsc.com/product-detail/Multilayer-Ceramic-Capacitors-MLCC---SMD-SMT_YAGEO-YAGEO-CC1210KKX7RCBB223_C389110.html
footprint CAP-1210 (1210 (3225M) Capacitor)
pins: 1, 2

## CC1210KKX7RCBB472
designator C?  Capacitance: 4.7nF  (hidden comment: *)
Capacitor, Ceramic (MLCC), 4.7nF, ±10%, 1kV, X7R, ±10%, SMD 1210; Manufacturer: YAGEO; Manufacturer Part Number: CC1210KKX7RCBB472; Package Size: 1210; JLCPCB Basic Part: No; JLCPCB Part Number: C577284; Supplier 1: LCSC; Category: Capacitors - MLCC; Supplier Part Number 1: C577284; Tolerance: ±10%; Voltage Rating: 1kV; Temperature Coefficient: X7R; RoHS: Yes; ComponentLink1Description: Datasheet; ComponentLink1URL: https://wmsc.lcsc.com/wmsc/upload/file/pdf/v2/lcsc/2105241311_YAGEO-CC1210KKX7RCBB472_C577284.pdf; ComponentLink2Description: JLCPCB Part URL; ComponentLink2URL: https://jlcpcb.com/partdetail/C577284; ComponentLink3Description: LCSC Part URL; ComponentLink3URL: https://lcsc.com/product-detail/Multilayer-Ceramic-Capacitors-MLCC---SMD-SMT_YAGEO-YAGEO-CC1210KKX7RCBB472_C577284.html
footprint CAP-1210 (1210 (3225M) Capacitor)
pins: 1, 2

## CC1210KKX7RDBB102
designator C?  Capacitance: 1nF  (hidden comment: *)
Capacitor, Ceramic (MLCC), 1nF, ±10%, 2kV, X7R, ±10%, SMD 1210; Manufacturer: YAGEO; Manufacturer Part Number: CC1210KKX7RDBB102; Package Size: 1210; JLCPCB Basic Part: No; JLCPCB Part Number: C527380; Supplier 1: LCSC; Category: Capacitors - MLCC; Supplier Part Number 1: C527380; Tolerance: ±10%; Voltage Rating: 2kV; Temperature Coefficient: X7R; RoHS: Yes; ComponentLink1Description: Datasheet; ComponentLink1URL: https://wmsc.lcsc.com/wmsc/upload/file/pdf/v2/lcsc/2311211121_YAGEO-CC1210KKX7RDBB102_C527380.pdf; ComponentLink2Description: JLCPCB Part URL; ComponentLink2URL: https://jlcpcb.com/partdetail/C527380; ComponentLink3Description: LCSC Part URL; ComponentLink3URL: https://lcsc.com/product-detail/Multilayer-Ceramic-Capacitors-MLCC---SMD-SMT_YAGEO-YAGEO-CC1210KKX7RDBB102_C527380.html
footprint CAP-1210 (1210 (3225M) Capacitor)
pins: 1, 2

## CC1210KKX7RDBB222
designator C?  Capacitance: 2.2nF  (hidden comment: *)
Capacitor, Ceramic (MLCC), 2.2nF, ±10%, 2kV, X7R, ±10%, SMD 1210; Manufacturer: YAGEO; Manufacturer Part Number: CC1210KKX7RDBB222; Package Size: 1210; JLCPCB Basic Part: No; JLCPCB Part Number: C326647; Supplier 1: LCSC; Category: Capacitors - MLCC; Supplier Part Number 1: C326647; Tolerance: ±10%; Voltage Rating: 2kV; Temperature Coefficient: X7R; RoHS: Yes; ComponentLink1Description: Datasheet; ComponentLink1URL: https://wmsc.lcsc.com/wmsc/upload/file/pdf/v2/lcsc/1811141242_YAGEO-CC1210KKX7RDBB222_C326647.pdf; ComponentLink2Description: JLCPCB Part URL; ComponentLink2URL: https://jlcpcb.com/partdetail/C326647; ComponentLink3Description: LCSC Part URL; ComponentLink3URL: https://lcsc.com/product-detail/Multilayer-Ceramic-Capacitors-MLCC---SMD-SMT_YAGEO-YAGEO-CC1210KKX7RDBB222_C326647.html
footprint CAP-1210 (1210 (3225M) Capacitor)
pins: 1, 2

## CC1210KKX7RYBB104
designator C?  Capacitance: 100nF  (hidden comment: *)
Capacitor, Ceramic (MLCC), 100nF, ±10%, 250V, X7R, ±10%, SMD 1210; Manufacturer: YAGEO; Manufacturer Part Number: CC1210KKX7RYBB104; Package Size: 1210; JLCPCB Basic Part: No; JLCPCB Part Number: C527381; Supplier 1: LCSC; Category: Capacitors - MLCC; Supplier Part Number 1: C527381; Tolerance: ±10%; Voltage Rating: 250V; Temperature Coefficient: X7R; RoHS: Yes; ComponentLink1Description: Datasheet; ComponentLink1URL: https://wmsc.lcsc.com/wmsc/upload/file/pdf/v2/lcsc/2006181535_YAGEO-CC1210KKX7RYBB104_C527381.pdf; ComponentLink2Description: JLCPCB Part URL; ComponentLink2URL: https://jlcpcb.com/partdetail/C527381; ComponentLink3Description: LCSC Part URL; ComponentLink3URL: https://lcsc.com/product-detail/Multilayer-Ceramic-Capacitors-MLCC---SMD-SMT_YAGEO-YAGEO-CC1210KKX7RYBB104_C527381.html
footprint CAP-1210 (1210 (3225M) Capacitor)
pins: 1, 2
